# Altium footprint library ParsaLibrary.PcbLib: 526 footprints (part 21 of 33)
Each footprint in its own frame and in the unit in brackets; x right, y up, seen from the top. Pads: shape width x height; smd on the part's side, far side on the other; paste and mask are expansions set on the pad; w line width, h text height; cw(c..) or ccw(c..) is an arc to the next point about the centre after c.
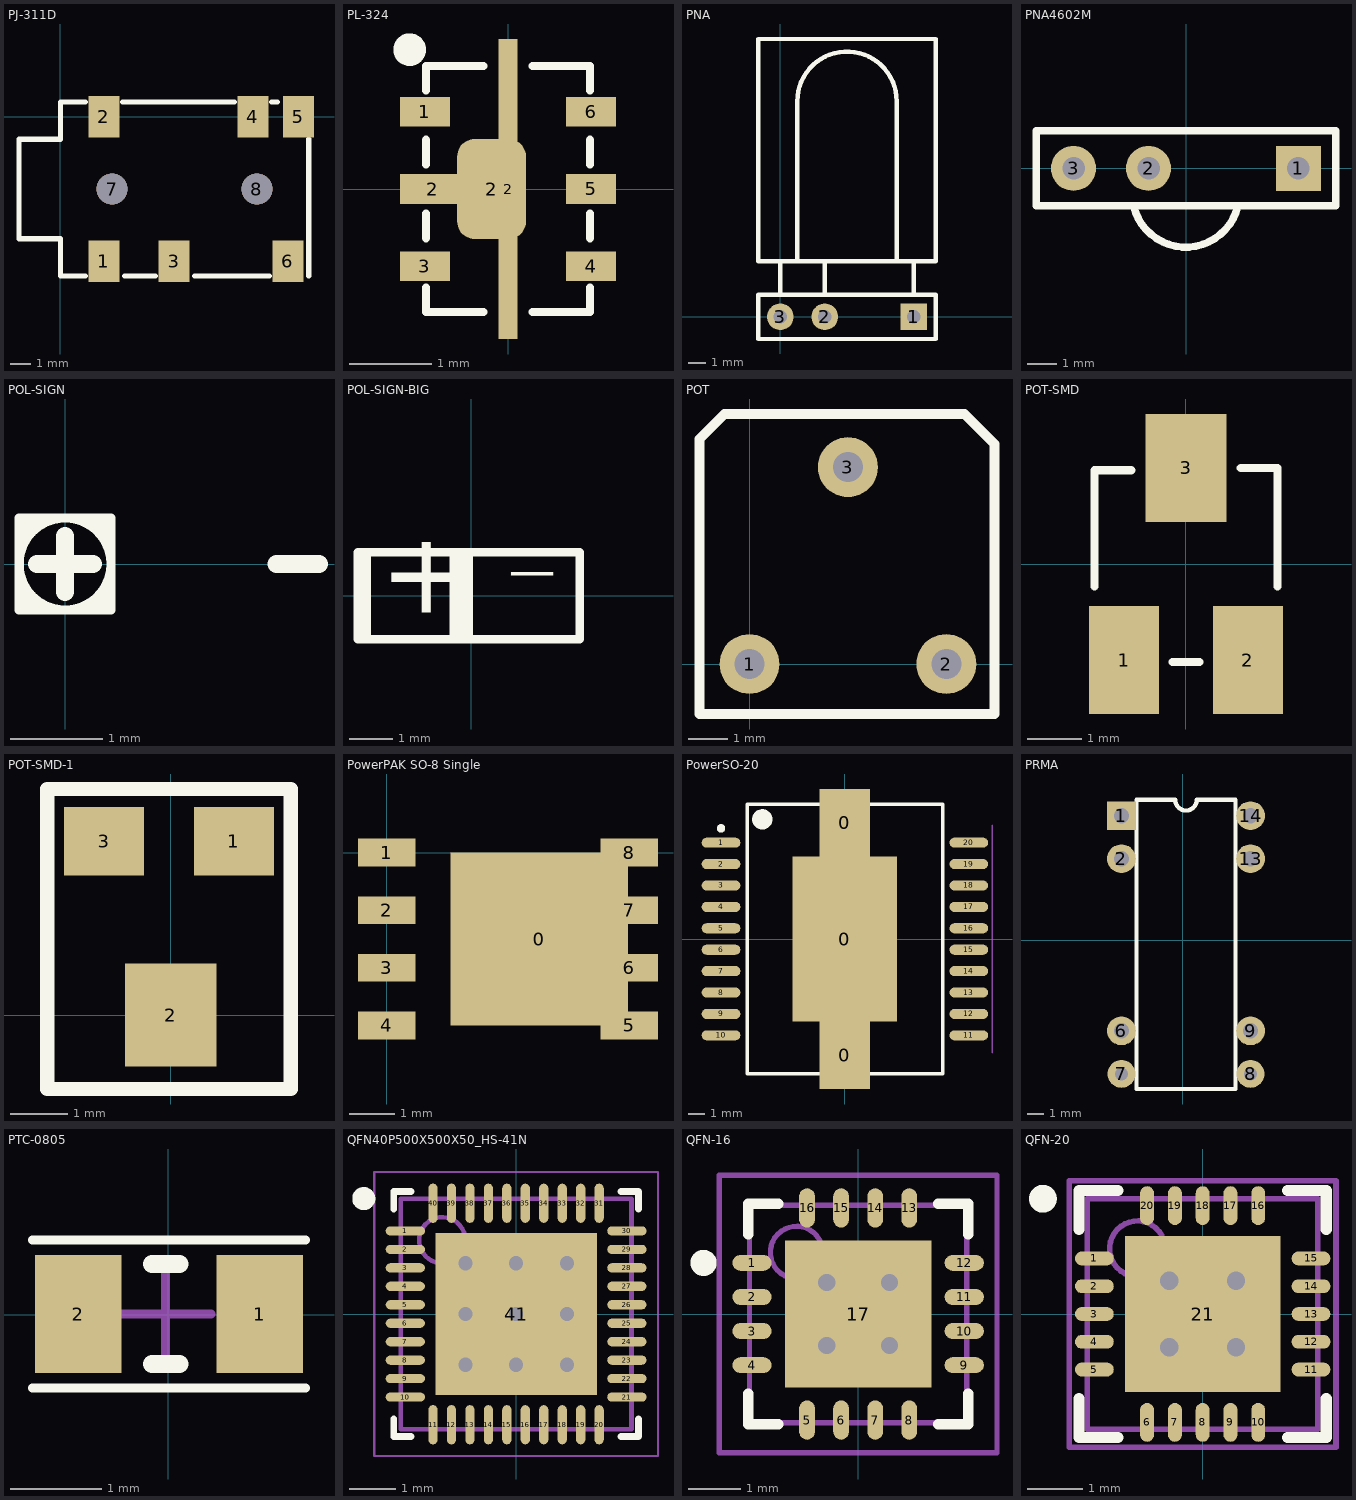
[diagram p20: the footprints below, top view; thin cyan lines are the x and y axes]

## PJ-311D [mm]
pads (8):
  rect 1.5x2 smd: 1(2.1,-7) 2(2.1,0) 3(5.5,-7) 4(9.3,0) 5(11.5,0) 6(11,-7)
  round 1.5 hole 1.5: 7(2.5,-3.5) 8(9.5,-3.5)
Top Overlay:
  lines w0.254: 1.2,-7.7 0,-7.7 0,-5.9 -2,-5.9 -2,-3.5 -2,-1.1 0,-1.1 0,0.7 1.2,0.7 ; 3,0.7 8.4,0.7 ; 3.1,-7.7 4.6,-7.7 ; 6.5,-7.7 10.1,-7.7 ; 10.2,0.7 10.5,0.7 ; 12,-7.7 12,-1.1
3D body "sj2-35894d-smt-tr.stp": height 4.92, standoff -0.48, extent -2,-7.65 12,0.65

## PL-324 [mm]
pads (8):
  rect 0.61x0.36 smd: 1(-1.015,0.94) 3(-1.015,-0.94) 4(1.015,-0.94) 5(1.015,0) 6(1.015,0.94)
  rect 0.8x0.36 smd: 2(-0.92,0)
  rrect50% 0.84x1.22 smd: 2(-0.2,0)
  rect 0.23x3.66 smd: 2(0,0)
Top Overlay:
  circle w0.2: c-1.2,1.7 r0.1
  lines w0.1: -1,-1.2 -1,-1.5 -0.3,-1.5 ; -1,-0.6 -1,-0.3 ; -1,0.3 -1,0.6 ; -1,1.2 -1,1.5 -0.3,1.5 ; 0.3,-1.5 1,-1.5 1,-1.2 ; 0.3,1.5 1,1.5 1,1.2 ; 1,-0.6 1,-0.3 ; 1,0.3 1,0.6

## PNA [mil] "IR RECIVER"
pads (3):
  rect 60x60 hole 30: 1(300,0)
  round 60 hole 30: 2(100,0) 3(0,0)
Top Overlay:
  lines w10: 0,50 0,125 ; 38.2,125 38.2,485 cw(c150,485) 261.8,485 261.8,125 ; 100,50 100,125 ; 300,50 300,120 ; -50,-50 -50,50 350,50 350,-50 -50,-50 ; -50,125 -50,625 350,625 350,125 -50,125

## PNA4602M [mil] "38KHz IR Reciver Module"
pads (3):
  rect 60x60 hole 30: 1(150,0)
  round 60 hole 30: 2(-50,0) 3(-150,0)
Top Overlay:
  lines w10: -70,-50 ccw(c-0.36,-33.41) 69.28,-50 ; -200,-50 200,-50 200,50 -200,50 -200,-50

## POL-SIGN [mm]
Top Overlay:
  circle w0.1: c0,0 r0.5
  region: -0.5,0.5 -0.2,0.5 -0.5,0.2
  region: 0.5,0.5 0.5,0.2 0.2,0.5
  region: 0.5,-0.5 0.2,-0.5 0.5,-0.2
  region: -0.5,-0.5 -0.5,-0.2 -0.2,-0.5
  lines w0.1: -0.5,-0.5 -0.5,0.5 0.5,0.5 0.5,-0.5 -0.5,-0.5
  lines w0.2: -0.3,0 0.3,0 ; 0,-0.3 0,0.3 ; 2.3,0 2.76,0

## POL-SIGN-BIG [mm]
Top Overlay:
  lines w0.2: -2.4,-1 -2.4,1 ; -0.4,-1 -0.4,1 -0.2,1 -0.2,-1 -0.05,-1 -0.05,1 0,1 ; -2.6,-1 -2.6,1 2.5,1 2.5,-1 -2.6,-1
  text "-" at 1.1,-0.74 h3.2
  text "-" at 0.8,-0.74 h3.2
  text "+" at -2.1,-1 h3.2

## POT [mil]
pads (3):
  round 60 hole 30: 1(0,0) 2(196.85,0) 3(98.43,196.85)
Top Overlay:
  lines w10: -50,-50 245,-50 245,220 215,250 -25,250 -50,225 -50,-50
3D body "Pot - RES_VAR1.STEP": height 295.28, standoff -133.86, extent -27.95,-54.68 227.95,222.87

## POT-SMD [mm]
pads (3):
  rect 1.3x2 smd: 1(-1.15,-1.784) 2(1.15,-1.784)
  rect 1.5x2 smd: 3(0,1.784)
Top Overlay:
  lines w0.15: -1.7,-0.419 -1.7,1.74 -1.016,1.74 ; -0.254,-1.816 0.254,-1.816 ; 1.016,1.784 1.7,1.784 1.7,-0.419
3D body "TRIMMER_PVG3A.STEP": height 2, standoff 0, extent -1.7,-1.816 1.7,1.784

## POT-SMD-1 [mm]
pads (3):
  rect 1.4x1.2 smd: 1(1.105,3.046) 3(-1.172,3.046)
  rect 1.6x1.8 smd: 2(0,0)
Top Overlay:
  lines w0.254: -2.167,-1.296 -2.167,3.962 2.1,3.962 2.1,-1.296 -2.167,-1.296

## PowerPAK SO-8 Single [mm]
pads (9):
  rect 3.91x3.81 smd: 0(3.36,-1.905)
  rect 1.27x0.61 smd: 1(0,0) 2(0,-1.27) 3(0,-2.54) 4(0,-3.81) 5(5.34,-3.81) 6(5.34,-2.54) 7(5.34,-1.27) 8(5.34,0)
3D body "User Library-PowerPAK SO-8 (S).step": height 1.04, standoff 0, extent -0.375,-4.5 5.775,0.65

## PowerSO-20 [mm]
pads (23):
  rect 3x4 smd: 0(0,-6.9) 0(0,6.9)
  rect 6.2x9.8 smd: 0(0,0)
  oval 2.3x0.6 smd: 1(-7.35,5.715) 2(-7.35,4.445) 3(-7.35,3.175) 4(-7.35,1.905) 5(-7.35,0.635) 6(-7.35,-0.635) 7(-7.35,-1.905) 8(-7.35,-3.175) 9(-7.35,-4.445) 10(-7.35,-5.715) 11(7.35,-5.715) 12(7.35,-4.445) 13(7.35,-3.175) 14(7.35,-1.905) 15(7.35,-0.635) 16(7.35,0.635) 17(7.35,1.905) 18(7.35,3.175) 19(7.35,4.445) 20(7.35,5.715)
Top Overlay:
  circle w0.25: c-7.35,6.565 r0.125
  circle w0.6: c-4.9,7.1 r0.3
  lines w0.2: -5.8,-8 -5.8,8 5.8,8 5.8,-8 -5.8,-8
Mechanical 15:
  lines w0.1: 8.75,-6.75 8.75,6.75
3D body "User Library-PowerSO20.STEP": height 3.6, standoff 0, extent -7.2,-8 7.2,8

## PRMA [mm]
pads (8):
  rect 1.7x1.7 hole 0.9: 1(-3.627,7.345)
  round 1.7 hole 0.9: 2(-3.627,4.805) 6(-3.627,-5.355) 9(3.993,-5.355) 13(3.993,4.805) 14(3.993,7.345)
  round 1.651 hole 0.762: 7(-3.627,-7.895) 8(3.993,-7.895)
Top Overlay:
  lines w0.254: -2.738,-8.787 -2.738,8.285 -0.452,8.285 ccw(c0.183,8.285) 0.818,8.285 3.104,8.285 3.104,-8.787 -2.738,-8.787
3D body "Standex-Meder Electronics-DIP-1A72-11L_WEB.step": height 6.27, standoff -1.27, extent -3.698,-9.93 4.172,9.37

## PTC-0805 [mm]
pads (2):
  rect 0.95x1.3 smd: 1(1.008,0.009) 2(-0.992,0.009)
Top Overlay:
  lines w0.1: -1.492,-0.804 1.508,-0.804 ; -1.492,0.822 1.508,0.822
  lines w0.2: -0.18,-0.541 0.12,-0.541 ; -0.18,0.559 0.12,0.559
Mechanical 15:
  lines w0.1: -0.53,0.009 0.47,0.009 ; -0.03,-0.491 -0.03,0.509
3D body "Part2.SLDPRT": height 0.66, standoff 0, extent -1.075,-0.675 1.075,0.675

## QFN40P500X500X50_HS-41N [mm]
pads (41):
  oval 0.85x0.2 smd: 1(-2.4,1.8) 2(-2.4,1.4) 3(-2.4,1) 4(-2.4,0.6) 5(-2.4,0.2) 6(-2.4,-0.2) 7(-2.4,-0.6) 8(-2.4,-1) 9(-2.4,-1.4) 10(-2.4,-1.8) 21(2.4,-1.8) 22(2.4,-1.4) 23(2.4,-1) 24(2.4,-0.6) 25(2.4,-0.2) 26(2.4,0.2) 27(2.4,0.6) 28(2.4,1) 29(2.4,1.4) 30(2.4,1.8)
  oval 0.2x0.85 smd: 11(-1.8,-2.4) 12(-1.4,-2.4) 13(-1,-2.4) 14(-0.6,-2.4) 15(-0.2,-2.4) 16(0.2,-2.4) 17(0.6,-2.4) 18(1,-2.4) 19(1.4,-2.4) 20(1.8,-2.4) 31(1.8,2.4) 32(1.4,2.4) 33(1,2.4) 34(0.6,2.4) 35(0.2,2.4) 36(-0.2,2.4) 37(-0.6,2.4) 38(-1,2.4) 39(-1.4,2.4) 40(-1.8,2.4)
  rect 3.5x3.5 smd: 41(0,0)
via 1.1,-1.1 diameter 0.61 hole 0.305
via 0,-1.1 diameter 0.61 hole 0.305
via -1.1,-1.1 diameter 0.61 hole 0.305
via 1.1,0 diameter 0.61 hole 0.305
via 0,0 diameter 0.61 hole 0.305
via -1.1,0 diameter 0.61 hole 0.305
via 1.1,1.1 diameter 0.61 hole 0.305
via 0,1.1 diameter 0.61 hole 0.305
via -1.1,1.1 diameter 0.61 hole 0.305
Top Overlay:
  circle w0.25: c-3.3,2.5 r0.125
  lines w0.15: -2.65,-2.275 -2.65,-2.65 -2.275,-2.65 ; -2.65,2.275 -2.65,2.65 -2.275,2.65 ; 2.275,-2.65 2.65,-2.65 2.65,-2.275 ; 2.275,2.65 2.65,2.65 2.65,2.275
Mechanical 7:
  circle w0.1: c-1.6,1.6 r0.5
  lines w0.1: -2.5,-2.5 2.5,-2.5 2.5,2.5 -2.5,2.5 -2.5,-2.5
Mechanical 15:
  lines w0.05: -3.075,-3.075 3.075,-3.075 3.075,3.075 -3.075,3.075 -3.075,-3.075
  lines w0.1: -0.5,0 0.5,0 ; 0,-0.5 0,0.5
3D body "QFN40P500X500X50_HS-41N.step": height 0.5, standoff 0, extent -2.501,-2.501 2.501,2.501

## QFN-16 [mm]
pads (17):
  oval 0.75x0.3 smd: 1(-2.025,0.975) 2(-2.025,0.325) 3(-2.025,-0.325) 4(-2.025,-0.975) 9(2.025,-0.975) 10(2.025,-0.325) 11(2.025,0.325) 12(2.025,0.975)
  oval 0.3x0.75 smd: 5(-0.975,-2.025) 6(-0.325,-2.025) 7(0.325,-2.025) 8(0.975,-2.025) 13(0.975,2.025) 14(0.325,2.025) 15(-0.325,2.025) 16(-0.975,2.025)
  rect 2.8x2.8 smd: 17(0,0)
via 0.6,-0.6 diameter 0.66 hole 0.33
via -0.6,-0.6 diameter 0.66 hole 0.33
via 0.6,0.6 diameter 0.66 hole 0.33
via -0.6,0.6 diameter 0.66 hole 0.33
Top Overlay:
  circle w0.25: c-2.95,0.975 r0.125
  lines w0.2: -2.1,-1.525 -2.1,-2.1 -1.525,-2.1 ; -2.1,1.525 -2.1,2.1 -1.525,2.1 ; 1.525,-2.1 2.1,-2.1 2.1,-1.525 ; 1.525,2.1 2.1,2.1 2.1,1.525
Mechanical 13:
  circle w0.1: c-1.175,1.175 r0.5
  lines w0.1: -2.075,-2.075 2.075,-2.075 2.075,2.075 -2.075,2.075 -2.075,-2.075
Mechanical 15:
  lines w0.1: -0.5,0 0.5,0 ; 0,-0.5 0,0.5 ; -2.65,-2.65 2.65,-2.65 2.65,2.65 -2.65,2.65 -2.65,-2.65
3D body: height 1, standoff 0, extent -2.075,-2.075 2.075,2.075

## QFN-20 [mm]
pads (21):
  oval 0.7x0.25 smd: 1(-1.95,1) 2(-1.95,0.5) 3(-1.95,0) 4(-1.95,-0.5) 5(-1.95,-1) 11(1.95,-1) 12(1.95,-0.5) 13(1.95,0) 14(1.95,0.5) 15(1.95,1)
  oval 0.25x0.7 smd: 6(-1,-1.95) 7(-0.5,-1.95) 8(0,-1.95) 9(0.5,-1.95) 10(1,-1.95) 16(1,1.95) 17(0.5,1.95) 18(0,1.95) 19(-0.5,1.95) 20(-1,1.95)
  rect 2.8x2.8 smd: 21(0,0)
via 0.6,-0.6 diameter 0.66 hole 0.33
via -0.6,-0.6 diameter 0.66 hole 0.33
via 0.6,0.6 diameter 0.66 hole 0.33
via -0.6,0.6 diameter 0.66 hole 0.33
Top Overlay:
  circle w0.25: c-2.875,2.075 r0.125
  lines w0.2: -2.225,-1.525 -2.225,-2.225 -1.525,-2.225 ; -2.225,1.525 -2.225,2.225 -1.525,2.225 ; 1.525,-2.225 2.225,-2.225 2.225,-1.525 ; 1.525,2.225 2.225,2.225 2.225,1.525
Mechanical 13:
  circle w0.1: c-1.175,1.175 r0.5
  lines w0.1: -2.075,-2.075 2.075,-2.075 2.075,2.075 -2.075,2.075 -2.075,-2.075
Mechanical 15:
  lines w0.1: -0.5,0 0.5,0 ; 0,-0.5 0,0.5 ; -2.4,-2.4 2.4,-2.4 2.4,2.4 -2.4,2.4 -2.4,-2.4
3D body "User Library-QFN20_4x4x0_8.step": height 0.78, standoff -0.02, extent -2.01,-2.01 2.01,2.01